# Altium footprint library LAN Transformer.PcbLib: 66 footprints (part 1 of 5)
Each footprint in its own frame and in the unit in brackets; x right, y up, seen from the top. Pads: shape width x height; smd on the part's side, far side on the other; paste and mask are expansions set on the pad; w line width, h text height; cw(c..) or ccw(c..) is an arc to the next point about the centre after c.
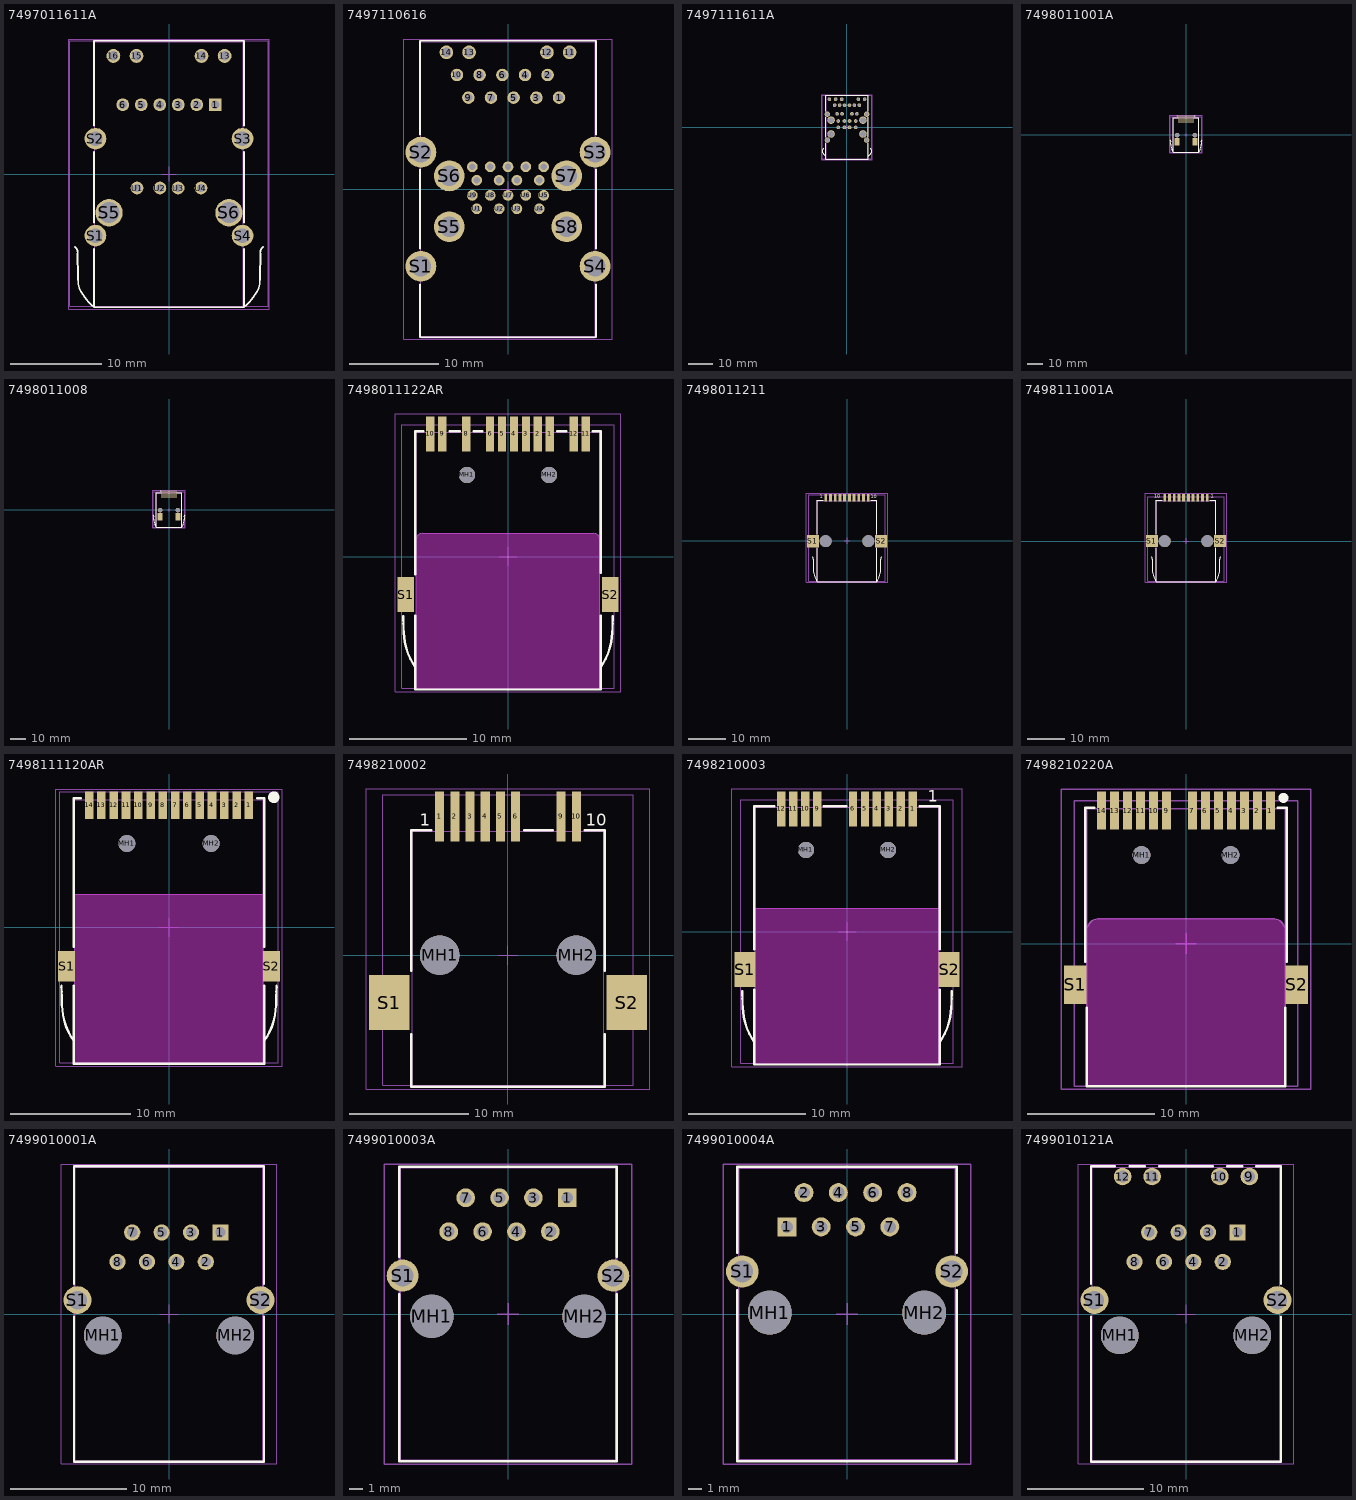
[diagram p0: the footprints below, top view; thin cyan lines are the x and y axes]

## 7497011611A [mm] "LAN Transformer, body 29x16.25mm"
height 21.3
pads (20):
  rect 1.4x1.4 hole 0.9: 1(5.07,7.6)
  round 1.4 hole 0.9: 2(3.04,7.6) 3(1.01,7.6) 4(-1.01,7.6) 5(-3.04,7.6) 6(-5.07,7.6) U1(-3.5,-1.54) U2(-1,-1.54) U3(1,-1.54) U4(3.5,-1.54)
  round 1.52 hole 1.02: 13(6.1,12.95) 14(3.56,12.95) 15(-3.56,12.95) 16(-6.1,12.95)
  round 2.37 hole 1.57: S1(-8.06,-6.75) S2(-8.06,3.87) S3(8.06,3.87) S4(8.06,-6.75)
  round 3 hole 2.31: S5(-6.57,-4.24) S6(6.57,-4.24)
Top Overlay:
  lines w0.2: -10.31,-8.013 cw(c-10.731,-8.599) -10.017,-8.7 -9.979,-11.305 ccw(c-3.1,-11.205) -9.953,-11.805 ccw(c-7.9,-11.805) -9.828,-12.51 ccw(c-4.4,-10.005) -8.225,-14.6 ; -8.225,-8.2 -8.225,-14.6 ; -8.225,-5.3 -8.225,2.4 ; -8.225,5.3 -8.225,14.6 8.225,14.6 8.225,5.3 ; 8.225,-8.2 8.225,-14.6 ; 8.225,-5.3 8.225,2.4 ; 10.31,-8.013 ccw(c10.731,-8.599) 10.017,-8.7 9.979,-11.305 cw(c3.1,-11.205) 9.953,-11.805 cw(c7.9,-11.805) 9.828,-12.51 cw(c4.4,-10.005) 8.225,-14.6 ; -8.225,-14.6 8.225,-14.6
Mechanical 11:
  lines w0.1: -8.125,-14.5 8.125,-14.5 8.125,14.5 -8.125,14.5 -8.125,-14.5
  text ".Designator" at 0,0 h1
Mechanical 13:
  lines w0.1: -10.865,-14.5 -10.865,14.6 10.865,14.6 10.865,-14.5 -10.865,-14.5
Mechanical 15:
  lines w0.1: -0.8,0 0.8,0 ; 0,-0.8 0,0.8 ; -11.01,-14.8 11.01,-14.8 11.01,14.8 -11.01,14.8 -11.01,-14.8
3D body "7497011611A.stp": height 24.39, standoff -3.7, extent -10.865,-14.6 10.865,14.5

## 7497110616 [mm] "LAN Transformer, body 33x19.5mm"
height 32
pads (40):
  round 1.4 hole 0.89: 1(5.715,10.23) 2(4.445,12.77) 3(3.175,10.23) 4(1.905,12.77) 5(0.635,10.23) 6(-0.635,12.77) 7(-1.905,10.23) 8(-3.175,12.77) 9(-4.445,10.23) 10(-5.715,12.77)
  round 1.53 hole 1.03: 11(6.9,15.31) 12(4.36,15.31) 13(-4.36,15.31) 14(-6.9,15.31)
  round 3.45 hole 2.3: S1(-9.75,-8.65) S2(-9.75,4.13) S3(9.75,4.13) S4(9.75,-8.65) S5(-6.57,-4.22) S6(-6.57,1.46) S7(6.57,1.46) S8(6.57,-4.22)
  round 1.2 hole 0.7: U1(-3.5,-2.22) U2(-1,-2.22) U3(1,-2.22) U4(3.5,-2.22) U5(4,-0.72) U6(2,-0.72) U7(0,-0.72) U8(-2,-0.72) U9(-4,-0.72) U10(-3.5,0.98) U11(-1,0.98) U12(1,0.98) U13(3.5,0.98) U14(4,2.48) U15(2,2.48) U16(0,2.48) U17(-2,2.48) U18(-4,2.48)
Top Overlay:
  lines w0.2: -9.85,-10.7 -9.85,-16.6 9.85,-16.6 9.85,-10.7 ; -9.85,-6.7 -9.85,2.2 ; -9.85,6.1 -9.85,16.6 9.85,16.6 9.85,6.1 ; 9.85,-6.7 9.85,2.2
Mechanical 11:
  lines w0.1: -9.75,-16.5 9.75,-16.5 9.75,16.5 -9.75,16.5 -9.75,-16.5
  text ".Designator" at 0,0 h1
Mechanical 13:
  lines w0.1: -9.75,-16.67 -9.75,16.5 9.75,16.5 9.75,-16.67 -9.75,-16.67
Mechanical 15:
  lines w0.1: -0.8,0 0.8,0 ; 0,-0.72 0,0.8 ; -11.675,-16.8 -11.675,16.8 11.675,16.8 11.675,-16.8 -11.675,-16.8
3D body "7497110616.stp": height 31.75, standoff -3.25, extent -9.75,-16.65 9.75,16.5

## 7497111611A [mm] "LAN Transformer, body 26.09x17.09mm"
height 29.67
pads (31):
  round 1.5 hole 0.97: 1(5.075,9.055) 2(3.045,9.055) 3(1.015,9.055) 4(-1.015,9.055) 5(-3.045,9.055) 6(-5.075,9.055) 7(4.06,5.505) 8(2.03,5.505) 9(-2.03,5.505) 10(-4.06,5.505) 11(7.225,11.485) 12(4.685,11.485) 14(-2.145,11.485) 15(-4.685,11.485) 16(-7.225,11.485) U1(-3.55,-0.085) U2(-1.05,-0.085) U3(1.05,-0.085) U4(3.55,-0.085) U5(-3.55,2.535) U6(-1.05,2.535) U7(1.05,2.535) U8(3.55,2.535)
  round 2.2 hole 1.57: S1(-8.065,-5.295) S2(-8.065,5.325) S3(8.065,5.325) S4(8.065,-5.295)
  round 3.1 hole 2.31: S5(-6.565,2.905) S6(6.565,2.905) S7(-6.565,-2.785) S8(6.565,-2.785)
Top Overlay:
  lines w0.2: -10.004,-9.277 ccw(c-8.751,-9.966) -10.176,-10.092 ccw(c-7.845,-9.245) -9.497,-11.095 cw(c-30.82,-33.32) -8.645,-11.945 ; -9.988,-9.229 cw(c-8.245,-9.845) -9.689,-8.69 ; -8.645,-6.545 -8.645,-13.145 8.645,-13.145 8.645,-6.545 ; -8.645,-4.045 -8.645,4.055 ; -8.645,6.555 -8.645,13.145 8.645,13.145 8.645,6.555 ; 8.645,-11.945 cw(c30.821,-33.32) 9.497,-11.095 ccw(c7.845,-9.245) 10.176,-10.092 ccw(c8.751,-9.966) 10.005,-9.277 ; 8.645,-4.045 8.645,4.055 ; 9.689,-8.69 cw(c8.245,-9.845) 9.989,-9.229
Mechanical 11:
  lines w0.1: -8.545,-13.045 8.545,-13.045 8.545,13.045 -8.545,13.045 -8.545,-13.045
  text ".Designator" at 0,0 h1
Mechanical 13:
  lines w0.1: -10.144,-13.045 -10.144,13.045 10.144,13.045 10.144,-13.045 -10.144,-13.045
Mechanical 15:
  lines w0.1: -0.8,0 0.8,0 ; 0,-0.8 0,0.8
  lines w0.2: -10.344,-13.345 -10.344,13.345 10.344,13.345 10.344,-13.345 -10.344,-13.345
3D body "7497111611A.stp": height 31.43, standoff -3.83, extent -10.144,-13.045 10.144,13.045

## 7498011001A [mm] "LAN Transformer, body 21.95x16.26mm"
height 13.6
pads (12):
  rect 0.76x5 smd: 1(-4.445,10.125) 2(-3.175,10.125) 3(-1.905,10.125) 4(-0.635,10.125) 5(0.635,10.125) 6(1.905,10.125) 7(3.175,10.125) 8(4.445,10.125)
  round 2.9 hole 2.9 unplated: MH1(-5.715,-0.075) MH2(5.715,-0.075)
  rect 3.42x4.58 smd: S1(-5.79,-4.315) S2(5.79,-4.315)
Top Overlay:
  lines w0.2: -10.12,-3.265 cw(c-10.63,-3.775) -9.916,-3.876 ccw(c2.77,-5.175) -9.899,-6.628 ccw(c4.334,-3.766) -9.039,-9.417 cw(c-49.045,-34.875) -8.441,-10.383 cw(c-9.628,-11.274) -8.23,-10.775 ; -5.1,11.075 -8.23,11.075 -8.23,-11.075 8.23,-11.075 8.23,11.075 5.1,11.075 ; 8.23,-10.775 cw(c9.628,-11.274) 8.441,-10.383 cw(c49.045,-34.875) 9.039,-9.417 ccw(c-4.334,-3.766) 9.899,-6.628 ccw(c-2.77,-5.175) 9.916,-3.876 cw(c10.63,-3.775) 10.12,-3.265
  text "8" at 5.3,11.325 h1
  text "1" at -5.8,11.325 h1
Mechanical 11:
  lines w0.1: -8.13,-10.975 8.13,-10.975 8.13,10.975 -8.13,10.975 -8.13,-10.975
  text ".Designator" at 0,0 h1
Mechanical 13:
  lines w0.1: -10.13,-10.975 -10.13,11.607 10.13,11.607 10.13,-10.975 -10.13,-10.975
Mechanical 15:
  lines w0.1: -0.8,0 0.8,0 ; 0,-0.8 0,0.8 ; -10.32,-11.275 10.32,-11.275 10.32,12.825 -10.32,12.825 -10.32,-11.275
3D body "7498011001A.stp": height 15.62, standoff -0.73, extent -10.13,-10.975 10.13,11.607

## 7498011008 [mm] "LAN Transformer, body 21.95x16.26mm"
height 13.6
pads (12):
  rect 0.76x5 smd: 1(-4.445,10.125) 2(-3.175,10.125) 3(-1.905,10.125) 4(-0.635,10.125) 5(0.635,10.125) 6(1.905,10.125) 7(3.175,10.125) 8(4.445,10.125)
  round 2.9 hole 2.9 unplated: MH1(-5.715,-0.075) MH2(5.715,-0.075)
  rect 3.42x4.58 smd: S1(-5.79,-4.315) S2(5.79,-4.315)
Top Overlay:
  lines w0.2: -10.12,-3.265 cw(c-10.63,-3.775) -9.916,-3.876 ccw(c2.77,-5.175) -9.899,-6.628 ccw(c4.334,-3.766) -9.039,-9.417 cw(c-49.045,-34.875) -8.441,-10.383 cw(c-9.628,-11.274) -8.23,-10.775 ; -5.1,11.075 -8.23,11.075 -8.23,-11.075 8.23,-11.075 8.23,11.075 5.1,11.075 ; 8.23,-10.775 cw(c9.628,-11.274) 8.441,-10.383 cw(c49.045,-34.875) 9.039,-9.417 ccw(c-4.334,-3.766) 9.899,-6.628 ccw(c-2.77,-5.175) 9.916,-3.876 cw(c10.63,-3.775) 10.12,-3.265
  text "1" at -5.7,11.5 h1
Mechanical 11:
  lines w0.1: -8.13,-10.975 8.13,-10.975 8.13,10.975 -8.13,10.975 -8.13,-10.975
  text ".Designator" at 0,0 h1
Mechanical 13:
  lines w0.1: -10.13,-10.975 -10.13,11.617 10.13,11.617 10.13,-10.975 -10.13,-10.975
Mechanical 15:
  lines w0.1: -0.8,0 0.8,0 ; 0,-0.8 0,0.8 ; -10.32,-11.275 -10.32,12.825 10.32,12.825 10.32,-11.275 -10.32,-11.275
3D body "7498011008.stp": height 15.62, standoff -0.73, extent -10.13,-10.975 10.13,11.617

## 7498011122AR [mm] "LAN Transformer, body 21.84x15.65mm"
height 8.89
pads (15):
  rect 0.71x3 smd: 1(3.57,10.46) 2(2.55,10.46) 3(1.53,10.46) 4(0.51,10.46) 5(-0.51,10.46) 6(-1.53,10.46) 8(-3.57,10.46) 9(-5.61,10.46) 10(-6.63,10.46) 11(6.63,10.46) 12(5.61,10.46)
  round 1.4 hole 1.4 unplated: MH1(-3.5,6.96) MH2(3.5,6.96)
  rect 1.4x3 smd: S1(-8.725,-3.24) S2(8.725,-3.24)
Top Overlay:
  lines w0.2: -8.926,-5.104 ccw(c-7.186,-5.201) -8.922,-5.351 ccw(c-7.183,-5.447) -8.919,-5.597 ccw(c-7.179,-5.694) -8.915,-5.843 ccw(c-7.175,-5.94) -8.911,-6.09 ccw(c-1.375,-5.89) -8.847,-6.888 ccw(c-3.725,-6.44) -7.933,-9.395 ; -7.925,-5.05 -7.925,-11.34 7.925,-11.34 7.925,-5.05 ; -7.925,-1.5 -7.925,10.7 -7.225,10.7 ; -4.975,10.7 -4.125,10.7 ; -2.925,10.7 -2.175,10.7 ; 4.175,10.7 4.975,10.7 ; 7.225,10.7 7.925,10.7 7.925,-1.4 ; 7.933,-9.395 ccw(c3.725,-6.44) 8.847,-6.888 ccw(c1.375,-5.89) 8.911,-6.09 ccw(c7.175,-5.94) 8.915,-5.843 ccw(c7.179,-5.694) 8.919,-5.597 ccw(c7.183,-5.447) 8.922,-5.351 ccw(c7.186,-5.201) 8.926,-5.104
Keep-Out Layer:
  board cut-out: -7.825,-11.24 -7.825,1.47 -7.825,1.569 -7.749,1.753 -7.608,1.894 -7.424,1.97 -7.325,1.97 7.325,1.97 7.424,1.97 7.608,1.894 7.749,1.753 7.825,1.569 7.825,1.47 7.825,-11.24
Mechanical 1:
  text "PCB Cutout Area" at -7.1,-6.54 h1
Mechanical 8:
  lines w0.1: -7.825,-11.24 7.825,-11.24 7.825,1.47 ccw(c7.325,1.47) 7.325,1.97 -7.325,1.97 ccw(c-7.325,1.47) -7.825,1.47 -7.825,-11.24
Mechanical 11:
  lines w0.1: -7.825,-11.24 -7.825,10.6 7.825,10.6 7.825,-11.24 -7.825,-11.24
  text ".Designator" at 0,0 h1
Mechanical 13:
  lines w0.1: -9.075,-11.24 -9.075,11.24 9.075,11.24 9.075,-11.24 -9.075,-11.24
Mechanical 15:
  lines w0.1: -0.8,0 0.8,0 ; 0,-0.8 0,0.8 ; -9.625,-11.54 -9.625,12.16 9.625,12.16 9.625,-11.54 -9.625,-11.54
3D body "7498011122AR.stp": height 10.1, standoff -3.2, extent -9.075,-11.24 9.075,10.835

## 7498011211 [mm] "LAN Transformer, body 21.65x15.88mm"
height 13.5
pads (14):
  rect 0.76x2.03 smd: 1(-5.715,11.615) 2(-4.445,11.615) 3(-3.175,11.615) 4(-1.905,11.615) 5(-0.635,11.615) 6(0.635,11.615) 7(1.905,11.615) 8(3.175,11.615) 9(4.445,11.615) 10(5.715,11.615)
  round 3.22 hole 3.22 unplated: MH1(-5.715,-0.065) MH2(5.715,-0.065)
  rect 3.3x3.3 smd: S1(-9.145,-0.065) S2(9.145,-0.065)
Top Overlay:
  lines w0.2: -9.209,-4.228 cw(c-10.32,-4.84) -9.053,-4.897 ccw(c-5.438,-5.337) -9.08,-5.367 ccw(c15.584,-6.195) -9.009,-8.239 ccw(c-0.59,-6.72) -8.04,-10.925 ; -8.04,-1.945 -8.04,-10.925 ; -8.04,1.815 -8.04,10.925 -6.33,10.925 ; 6.33,10.925 8.04,10.925 8.04,1.815 ; 8.04,-1.945 8.04,-10.925 ; 9.209,-4.228 ccw(c10.32,-4.84) 9.053,-4.897 cw(c5.438,-5.337) 9.08,-5.367 cw(c-15.584,-6.195) 9.009,-8.239 cw(c0.59,-6.72) 8.04,-10.925 ; -8.04,-10.925 8.04,-10.925
  text "10" at 6.4,11.4 h1
  text "1" at -7.3,11.4 h1
Mechanical 11:
  lines w0.1: -7.94,-10.825 7.94,-10.825 7.94,10.825 -7.94,10.825 -7.94,-10.825
  text ".Designator" at 0,0 h1
Mechanical 13:
  lines w0.1: -10.25,-10.825 -10.25,12.36 10.25,12.36 10.25,-10.825 -10.25,-10.825
Mechanical 15:
  lines w0.1: -0.8,0 0.8,0 ; 0,-0.8 0,0.8 ; -10.995,-11.125 10.995,-11.125 10.995,12.83 -10.995,12.83 -10.995,-11.125
3D body "7498011211.stp": height 14.82, standoff -2.7, extent -10.25,-10.79 10.25,12.36

## 7498111001A [mm] "LAN Transformer, body 21.6x15.88mm"
height 13.5
pads (14):
  rect 0.76x2.03 smd: 1(5.715,11.64) 2(4.445,11.64) 3(3.175,11.64) 4(1.905,11.64) 5(0.635,11.64) 6(-0.635,11.64) 7(-1.905,11.64) 8(-3.175,11.64) 9(-4.445,11.64) 10(-5.715,11.64)
  round 3.22 hole 3.22 unplated: MH1(-5.715,-0.04) MH2(5.715,-0.04)
  rect 3.3x3.18 smd: S1(-9.145,-0.04) S2(9.145,-0.04)
Top Overlay:
  lines w0.2: -9.209,-4.203 cw(c-10.32,-4.815) -9.053,-4.872 ccw(c-5.438,-5.312) -9.08,-5.342 ccw(c15.584,-6.17) -9.009,-8.214 ccw(c-0.59,-6.695) -8.04,-10.9 ; -8.04,-1.92 -8.04,-10.9 ; -8.04,1.84 -8.04,10.9 -6.33,10.9 ; 6.33,10.9 8.04,10.9 8.04,1.84 ; 8.04,-1.92 8.04,-10.9 ; 9.209,-4.203 ccw(c10.32,-4.815) 9.053,-4.872 cw(c5.438,-5.312) 9.08,-5.342 cw(c-15.584,-6.17) 9.009,-8.214 cw(c0.59,-6.695) 8.04,-10.9 ; -8.04,-10.9 8.04,-10.9
  text "10" at -8.5,11.56 h1
  text "1" at 6.7,11.56 h1
Mechanical 11:
  lines w0.1: -7.94,-10.8 -7.94,10.8 7.94,10.8 7.94,-10.8 -7.94,-10.8
  text ".Designator" at 0,0 h1
Mechanical 13:
  lines w0.1: -10.25,-10.74 10.25,-10.74 10.25,11.86 -10.25,11.86 -10.25,-10.74
Mechanical 15:
  lines w0.1: -0.8,0 0.8,0 ; 0,-0.8 0,0.8 ; -10.995,-11.1 -10.995,12.855 10.995,12.855 10.995,-11.1 -10.995,-11.1
3D body "7498111001.stp": height 13.6, standoff -2.62, extent -10.25,-10.74 10.25,11.86

## 7498111120AR [mm] "LAN Transformer, body 21.84x15.65mm"
height 8.89
pads (18):
  rect 0.71x2.29 smd: 1(6.63,10.14) 2(5.61,10.14) 3(4.59,10.14) 4(3.57,10.14) 5(2.55,10.14) 6(1.53,10.14) 7(0.51,10.14) 8(-0.51,10.14) 9(-1.53,10.14) 10(-2.55,10.14) 11(-3.57,10.14) 12(-4.59,10.14) 13(-5.61,10.14) 14(-6.63,10.14)
  round 1.4 hole 1.4 unplated: MH1(-3.5,6.96) MH2(3.5,6.96)
  rect 1.4x2.54 smd: S1(-8.51,-3.24) S2(8.51,-3.24)
Top Overlay:
  circle w0.5: c8.7,10.8 r0.224
  lines w0.2: -8.93,-4.858 ccw(c-7.19,-4.955) -8.926,-5.104 ccw(c-7.186,-5.201) -8.922,-5.351 ccw(c-7.183,-5.447) -8.919,-5.597 ccw(c-7.179,-5.694) -8.915,-5.843 ccw(c-7.175,-5.94) -8.911,-6.09 ccw(c-1.375,-5.89) -8.847,-6.888 ccw(c-3.725,-6.44) -7.933,-9.395 ; -7.925,-4.84 -7.925,-11.34 7.925,-11.34 7.925,-4.84 ; -7.925,-1.64 -7.925,10.7 -7.315,10.7 ; 7.315,10.7 7.925,10.7 7.925,-1.64 ; 7.933,-9.395 ccw(c3.725,-6.44) 8.847,-6.888 ccw(c1.375,-5.89) 8.911,-6.09 ccw(c7.175,-5.94) 8.915,-5.843 ccw(c7.179,-5.694) 8.919,-5.597 ccw(c7.183,-5.447) 8.922,-5.351 ccw(c7.186,-5.201) 8.926,-5.104 ccw(c7.19,-4.955) 8.93,-4.858
Keep-Out Layer:
  board cut-out: -7.81,-11.24 -7.81,2.73 7.81,2.73 7.81,-11.24
Mechanical 1:
  text "PCB Cutout Area" at -7.2,-4.13 h1
Mechanical 8:
  lines w0.1: -7.81,-11.24 7.81,-11.24 7.81,2.73 -7.81,2.73 -7.81,-11.24
Mechanical 11:
  lines w0.1: -7.825,-11.24 -7.825,10.6 7.825,10.6 7.825,-11.24 -7.825,-11.24
  text ".Designator" at 0,0 h1
Mechanical 13:
  lines w0.1: -9.075,-11.24 9.075,-11.24 9.075,11.24 -9.075,11.24 -9.075,-11.24
Mechanical 15:
  lines w0.1: -9.41,-11.54 9.41,-11.54 ; -9.41,-11.485 -9.41,11.485 9.41,11.485 9.41,-11.485 ; -0.8,0 0.8,0 ; 0,-0.8 0,0.8
3D body "7498111120AR.stp": height 10.1, standoff -3.2, extent -9.075,-11.24 9.075,11.24

## 7498210002 [mm] "LAN Transformer, body 21.25x16mm"
height 13.6
pads (12):
  rect 0.76x4.18 smd: 1(-5.715,11.61) 2(-4.445,11.61) 3(-3.175,11.61) 4(-1.905,11.61) 5(-0.635,11.61) 6(0.635,11.61) 9(4.445,11.61) 10(5.715,11.61)
  round 3.3 hole 3.3 unplated: MH1(-5.715,0) MH2(5.715,0)
  rect 3.42x4.58 smd: S1(-9.94,-3.97) S2(9.94,-3.97)
Top Overlay:
  lines w0.2: -8.1,-6.6 -8.1,-11 8.1,-11 8.1,-6.6 ; -8.1,-1.3 -8.1,10.45 -6.4,10.45 ; 1.35,10.45 3.75,10.45 ; 6.4,10.45 8.1,10.45 8.1,-1.3
  text "1" at -7.4,10.825 h1
  text "10" at 6.5,10.825 h1
Mechanical 11:
  lines w0.1: -8,-10.9 -8,10.35 8,10.35 8,-10.9 -8,-10.9
  text ".Designator" at -0.5,-0.5 h1
Mechanical 13:
  lines w0.1: -10.5,-10.9 10.5,-10.9 10.5,13.43 -10.5,13.43 -10.5,-10.9
Mechanical 15:
  lines w0.1: -0.8,0 0.8,0 ; 0,-0.8 0,0.8 ; -11.85,-11.2 -11.85,13.9 11.85,13.9 11.85,-11.2 -11.85,-11.2
3D body "7498210002.stp": height 13.62, standoff -0.98, extent -10.5,-10.9 10.5,13.43

## 7498210003 [mm] "LAN Transformer, body 22.48x15.65mm"
height 11.3
pads (14):
  rect 0.71x3 smd: 1(5.61,10.46) 2(4.59,10.46) 3(3.57,10.46) 4(2.55,10.46) 5(1.53,10.46) 6(0.51,10.46) 9(-2.55,10.46) 10(-3.57,10.46) 11(-4.59,10.46) 12(-5.61,10.46)
  round 1.4 hole 1.4 unplated: MH1(-3.5,6.96) MH2(3.5,6.96)
  rect 1.8x3 smd: S1(-8.71,-3.24) S2(8.71,-3.24)
Top Overlay:
  lines w0.2: -8.926,-5.104 ccw(c-7.186,-5.201) -8.922,-5.351 ccw(c-7.183,-5.447) -8.919,-5.597 ccw(c-7.179,-5.694) -8.915,-5.843 ccw(c-7.175,-5.94) -8.911,-6.09 ccw(c-1.375,-5.89) -8.847,-6.888 ccw(c-3.725,-6.44) -7.933,-9.395 ; -7.925,-4.97 -7.925,-11.34 7.925,-11.34 7.925,-4.97 ; -7.925,-1.51 -7.925,10.7 -6.195,10.7 ; -1.975,10.7 -0.065,10.7 ; 6.195,10.7 7.925,10.7 7.925,-1.51 ; 7.933,-9.395 ccw(c3.725,-6.44) 8.847,-6.888 ccw(c1.375,-5.89) 8.911,-6.09 ccw(c7.175,-5.94) 8.915,-5.843 ccw(c7.179,-5.694) 8.919,-5.597 ccw(c7.183,-5.447) 8.922,-5.351 ccw(c7.186,-5.201) 8.926,-5.104
  text "1" at 6.9,11.06 h1
Keep-Out Layer:
  board cut-out: -7.81,-11.24 -7.81,1.97 7.81,1.97 7.81,-11.24
Mechanical 1:
  text "PCB Cutout Area" at -7.07,-4.92 h1
Mechanical 8:
  lines w0.1: -7.81,-11.24 7.81,-11.24 7.81,1.97 -7.81,1.97 -7.81,-11.24
Mechanical 11:
  lines w0.1: -7.825,-11.24 7.825,-11.24 7.825,10.6 -7.825,10.6 -7.825,-11.24
  text ".Designator" at 0,0 h1
Mechanical 13:
  lines w0.1: -9.075,-11.24 -9.075,11.24 9.075,11.24 9.075,-11.24 -9.075,-11.24
Mechanical 15:
  lines w0.1: -0.8,0 0.8,0 ; 0,-0.8 0,0.8 ; -9.81,-11.54 -9.81,12.16 9.81,12.16 9.81,-11.54 -9.81,-11.54
3D body "7498210003.stp": height 10.1, standoff -3.2, extent -9.075,-11.24 9.075,11.24

## 7498210220A [mm] "LAN Transformer, body 21.84x15.65mm"
height 8.89
pads (17):
  rect 0.71x3 smd: 1(6.63,10.46) 2(5.61,10.46) 3(4.59,10.46) 4(3.57,10.46) 5(2.55,10.46) 6(1.53,10.46) 7(0.51,10.46) 9(-1.53,10.46) 10(-2.55,10.46) 11(-3.57,10.46) 12(-4.59,10.46) 13(-5.61,10.46) 14(-6.63,10.46)
  round 1.4 hole 1.4 unplated: MH1(-3.5,6.96) MH2(3.5,6.96)
  rect 1.8x3 smd: S1(-8.71,-3.24) S2(8.71,-3.24)
Top Overlay:
  circle w0.5: c7.666,11.46 r0.141
  lines w0.2: -7.925,-1.44 -7.925,10.7 -7.215,10.7 ; -7.825,-5.04 -7.825,-11.24 7.825,-11.24 7.825,-5.04 ; 7.215,10.7 7.925,10.7 7.925,-1.44
Keep-Out Layer:
  board cut-out: -7.81,-11.24 7.81,-11.24 7.81,0.97 7.81,1.068 7.772,1.262 7.696,1.444 7.587,1.607 7.447,1.747 7.284,1.856 7.102,1.932 6.908,1.97 6.81,1.97 -6.81,1.97 -6.908,1.97 -7.102,1.932 -7.284,1.856 -7.447,1.747 -7.587,1.607 -7.696,1.444 -7.772,1.262 -7.81,1.068 -7.81,0.97
Mechanical 1:
  text "PCB Cutout Area" at -7.2,-4.8 h1
Mechanical 8:
  lines w0.1: -7.81,-11.24 7.81,-11.24 7.81,0.97 ccw(c6.81,0.97) 6.81,1.97 -6.81,1.97 ccw(c-6.81,0.97) -7.81,0.97 -7.81,-11.24
Mechanical 11:
  lines w0.1: -7.825,-11.24 -7.825,10.6 7.825,10.6 7.825,-11.24 -7.825,-11.24
  text ".Designator" at 0,0 h1
Mechanical 13:
  lines w0.1: -8.775,-11.24 8.775,-11.24 8.775,11.235 -8.775,11.235 -8.775,-11.24
Mechanical 15:
  lines w0.1: -0.8,0 0.8,0 ; 0,-0.8 0,0.8 ; -9.81,-11.44 -9.81,12.16 9.81,12.16 9.81,-11.44 -9.81,-11.44
3D body "7498210220A.stp": height 8.9, standoff -2.4, extent -8.775,-11.24 8.775,11.235

## 7499010001A [mm] "LAN Transformer, body 25.3x16.2mm"
height 13.5
pads (12):
  rect 1.4x1.4 hole 0.9: 1(4.445,7.04)
  round 1.4 hole 0.9: 2(3.175,4.5) 3(1.905,7.04) 4(0.635,4.5) 5(-0.635,7.04) 6(-1.905,4.5) 7(-3.175,7.04) 8(-4.445,4.5)
  round 3.25 hole 3.25 unplated: MH1(-5.715,-1.85) MH2(5.715,-1.85)
  round 2.4 hole 1.6: S1(-7.9,1.2) S2(7.9,1.2)
Top Overlay:
  lines w0.2: -8.2,-0.22 -8.2,-12.75 8.2,-12.75 8.2,-0.22 ; -8.2,2.62 -8.2,12.75 8.2,12.75 8.2,2.62
Mechanical 11:
  lines w0.1: -8.1,-12.65 -8.1,12.65 8.1,12.65 8.1,-12.65 -8.1,-12.65
  text ".Designator" at 0,0 h1
Mechanical 13:
  lines w0.1: -8.2,-12.65 8.2,-12.65 8.2,12.65 -8.2,12.65 -8.2,-12.65
Mechanical 15:
  lines w0.1: -0.8,0 0.8,0 ; 0,-0.8 0,0.8 ; -9.3,-12.95 9.3,-12.95 9.3,12.95 -9.3,12.95 -9.3,-12.95
3D body "7499010001A.stp": height 13.75, standoff -3.3, extent -8.2,-12.65 8.2,12.65

## 7499010003A [mm] "LAN Transformer, body 21.84x16.13mm"
height 13.74
pads (12):
  rect 1.4x1.4 hole 0.89: 1(4.445,8.72)
  round 1.4 hole 0.89: 2(3.175,6.18) 3(1.905,8.72) 4(0.635,6.18) 5(-0.635,8.72) 6(-1.905,6.18) 7(-3.175,8.72) 8(-4.445,6.18)
  round 3.25 hole 3.25 unplated: MH1(-5.715,-0.17) MH2(5.715,-0.17)
  round 2.4 hole 1.6: S1(-7.9,2.88) S2(7.9,2.88)
Top Overlay:
  lines w0.2: -8.165,1.46 -8.165,-11.05 8.165,-11.05 8.165,1.46 ; -8.165,4.3 -8.165,11.05 8.165,11.05 8.165,4.3
Mechanical 11:
  lines w0.1: -8.065,-10.95 -8.065,10.95 8.065,10.95 8.065,-10.95 -8.065,-10.95
  text ".Designator" at 0,0 h1
Mechanical 13:
  lines w0.1: -8.165,-10.95 -8.165,10.95 8.165,10.95 8.165,-10.95 -8.165,-10.95
Mechanical 15:
  lines w0.1: -0.8,0 0.8,0 ; 0,-0.8 0,0.8 ; -9.3,-11.25 -9.3,11.25 9.3,11.25 9.3,-11.25 -9.3,-11.25
3D body "7499010003A.stp": height 13.72, standoff -3.07, extent -8.165,-10.92 8.165,10.92

## 7499010004A [mm] "LAN Transformer, body 21.59x16.04mm"
height 13.74
pads (12):
  rect 1.4x1.4 hole 0.9: 1(-4.45,6.445)
  round 1.4 hole 0.9: 2(-3.18,8.985) 3(-1.91,6.445) 4(-0.64,8.985) 5(0.63,6.445) 6(1.9,8.985) 7(3.17,6.445) 8(4.44,8.985)
  round 3.25 hole 3.25 unplated: MH1(-5.715,0.095) MH2(5.715,0.095)
  round 2.4 hole 1.6: S1(-7.745,3.145) S2(7.745,3.145)
Top Overlay:
  lines w0.2: -8.12,1.735 -8.12,-10.895 8.12,-10.895 8.12,1.735 ; -8.12,4.555 -8.12,10.895 8.12,10.895 8.12,4.555
Mechanical 11:
  lines w0.1: -8.02,-10.795 -8.02,10.795 8.02,10.795 8.02,-10.795 -8.02,-10.795
  text ".Designator" at 0,0 h1
Mechanical 13:
  lines w0.1: -8.02,-10.795 8.02,-10.795 8.02,10.795 -8.02,10.795 -8.02,-10.795
Mechanical 15:
  lines w0.1: -0.8,0 0.8,0 ; 0,-0.8 0,0.8 ; -9.145,-11.095 -9.145,11.095 9.145,11.095 9.145,-11.095 -9.145,-11.095
3D body "7499010004A.stp": height 13.74, standoff -4, extent -8.02,-10.795 8.02,10.795

## 7499010121A [mm] "LAN Transformer, body 25.3x16.2mm"
height 13.5
pads (16):
  rect 1.4x1.4 hole 0.9: 1(4.445,7.04)
  round 1.4 hole 0.9: 2(3.175,4.5) 3(1.905,7.04) 4(0.635,4.5) 5(-0.635,7.04) 6(-1.905,4.5) 7(-3.175,7.04) 8(-4.445,4.5)
  round 1.52 hole 1.02: 9(5.465,11.87) 10(2.925,11.87) 11(-2.925,11.87) 12(-5.465,11.87)
  round 3.25 hole 3.25 unplated: MH1(-5.715,-1.85) MH2(5.715,-1.85)
  round 2.4 hole 1.6: S1(-7.9,1.2) S2(7.9,1.2)
Top Overlay:
  lines w0.2: -8.2,-0.23 -8.2,-12.75 8.2,-12.75 8.2,-0.23 ; -8.2,2.61 -8.2,12.75 -6.16,12.75 ; -4.86,12.75 -3.54,12.75 ; -2.32,12.75 2.32,12.75 ; 3.54,12.75 4.86,12.75 ; 6.06,12.75 8.2,12.75 8.2,2.61
Mechanical 11:
  lines w0.1: -8.1,-12.65 8.1,-12.65 8.1,12.65 -8.1,12.65 -8.1,-12.65
  text ".Designator" at 0,0 h1
Mechanical 13:
  lines w0.1: -8.1,-12.65 -8.1,12.65 8.1,12.65 8.1,-12.65 -8.1,-12.65
Mechanical 15:
  lines w0.1: -0.8,0 0.8,0 ; 0,-0.8 0,0.8 ; -9.3,-12.95 9.3,-12.95 9.3,12.95 -9.3,12.95 -9.3,-12.95
3D body "7499010121A.stp": height 13.61, standoff -3.79, extent -8.2,-12.65 8.2,12.65